# Altium footprint library bethu.PcbLib: 628 footprints (part 7 of 40)
Each footprint in its own frame and in the unit in brackets; x right, y up, seen from the top. Pads: shape width x height; smd on the part's side, far side on the other; paste and mask are expansions set on the pad; w line width, h text height; cw(c..) or ccw(c..) is an arc to the next point about the centre after c.
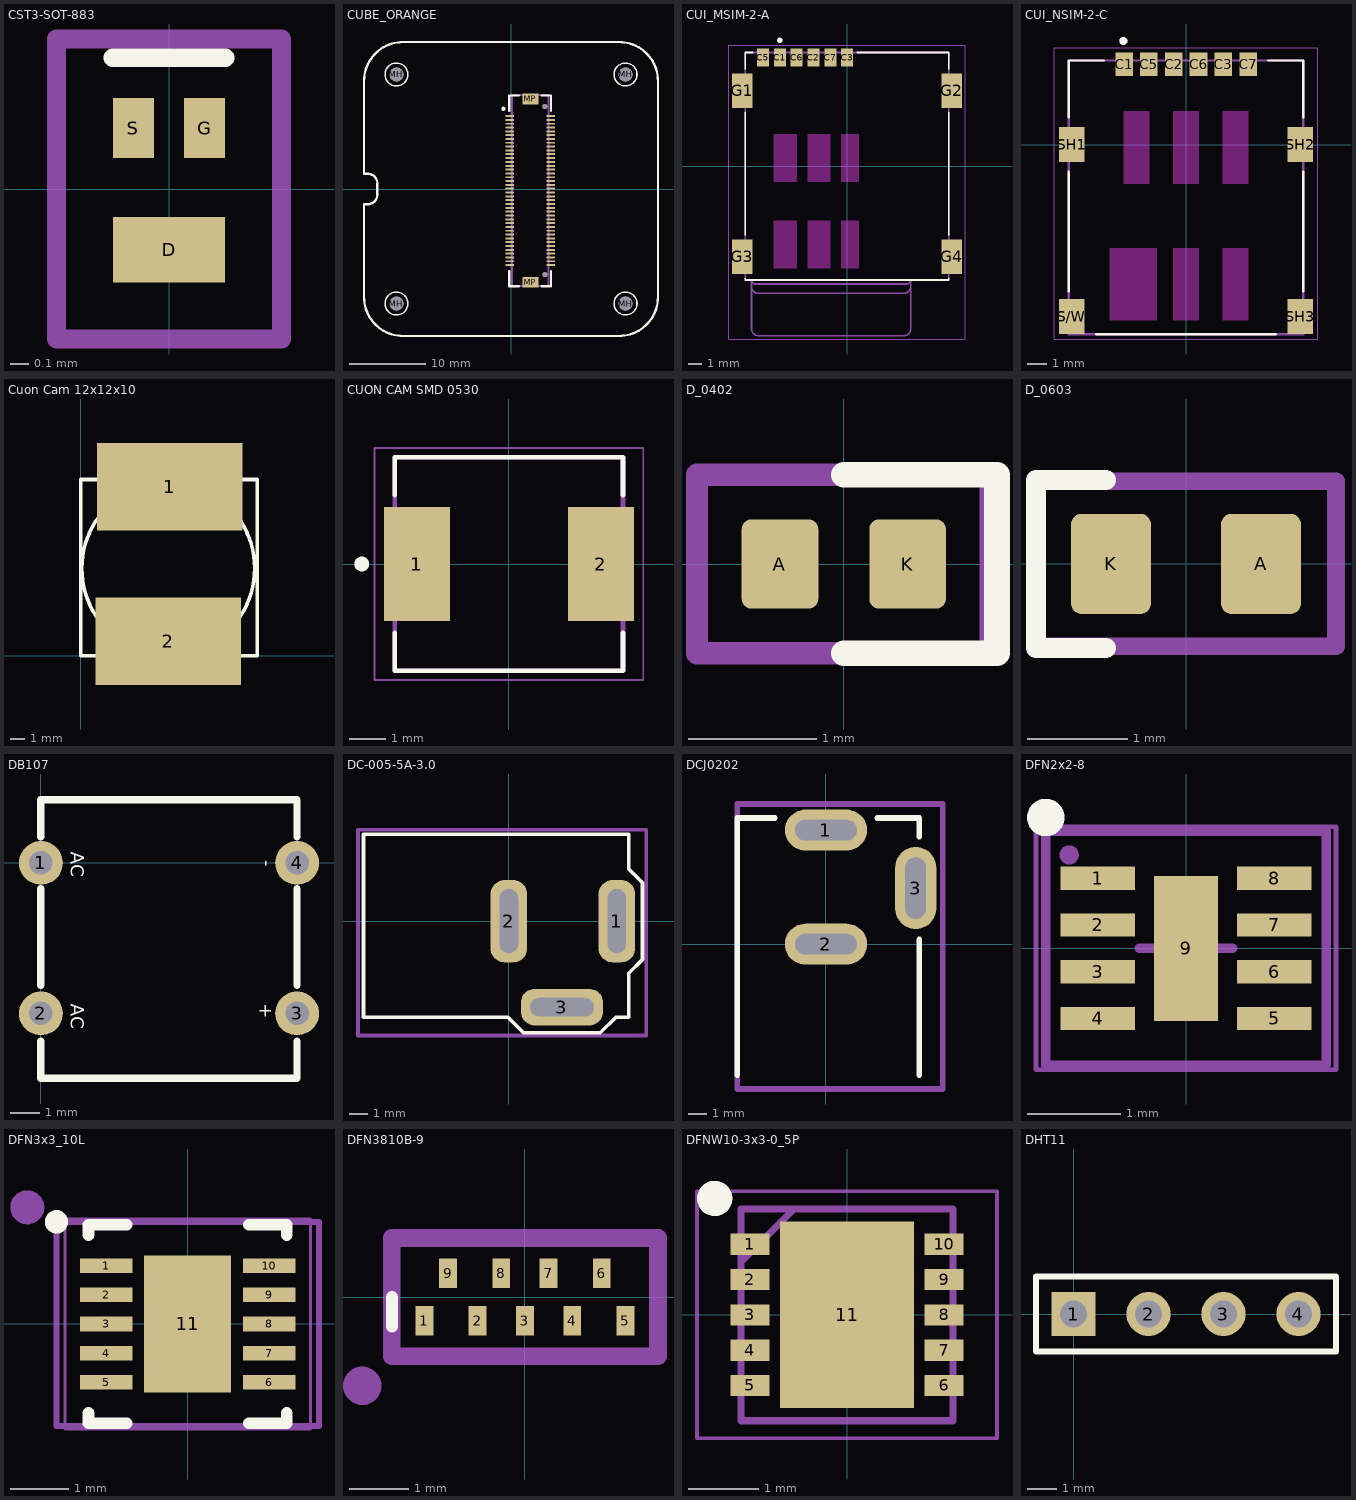
[diagram p6: the footprints below, top view; thin cyan lines are the x and y axes]

## CST3-SOT-883 [mm]
pads (3):
  rect 0.6x0.35 smd: D(0,-0.325)
  rect 0.22x0.32 smd: G(0.19,0.325) S(-0.19,0.325)
Top Overlay:
  lines w0.1: -0.3,0.7 0.3,0.7
Mechanical 13:
  lines w0.1: -0.6,-0.8 -0.6,0.8 0.6,0.8 0.6,-0.8 -0.6,-0.8
  text "'.Designator'" at -5.665,-0.417 h1
3D body "CST3.STEP": height 0.39, standoff 0.01, extent -0.3,-0.5 0.3,0.5

## CUBE_ORANGE [mil]
pads (88):
  rect 44x10 smd mask+7.87: 1(-5.5,375.5) 2(203.83,375.5) 3(-5.5,356.5) 4(203.83,356.5) 5(-5.5,336.5) 6(203.83,336.5) 7(-5.5,316.5) 8(203.83,316.5) 9(-5.5,297.5) 10(203.83,297.5) 11(-5.5,277.5) 12(203.83,277.5) 13(-5.5,257.5) 14(203.83,257.5) 15(-5.5,238.5) 16(203.83,238.5) 17(-5.5,218.5) 18(203.83,218.5) 19(-5.5,198.5) 20(203.83,198.5) 21(-5.5,179.5) 22(203.83,179.5) 23(-5.5,159.5) 24(203.83,159.5) 25(-5.5,139.5) 26(203.83,139.5) 27(-5.5,119.5) 28(203.83,119.5) 29(-5.5,100.5) 30(203.83,100.5) 31(-5.5,80.5) 32(203.83,80.5) 33(-5.5,60.5) 34(203.83,60.5) 35(-5.5,41.5) 36(203.83,41.5) 37(-5.5,21.5) 38(203.83,21.5) 39(-5.5,1.5) 40(203.83,1.5) 41(-5.5,-18.34) 42(203.83,-18.34) 43(-5.5,-38.03) 44(203.83,-38.03) 45(-5.5,-57.71) 46(203.83,-57.71) 47(-5.5,-77.4) 48(203.83,-77.4) 49(-5.5,-97.08) 50(203.83,-97.08) 51(-5.5,-116.77) 52(203.83,-116.77) 53(-5.5,-136.45) 54(203.83,-136.45) 55(-5.5,-156.14) 56(203.83,-156.14) 57(-5.5,-175.82) 58(203.83,-175.82) 59(-5.5,-195.51) 60(203.83,-195.51) 61(-5.5,-215.19) 62(203.83,-215.19) 63(-5.5,-234.88) 64(203.83,-234.88) 65(-5.5,-254.56) 66(203.83,-254.56) 67(-5.5,-274.25) 68(203.83,-274.25) 69(-5.5,-293.93) 70(203.83,-293.93) 71(-5.5,-313.62) 72(203.83,-313.62) 73(-5.5,-333.3) 74(203.83,-333.3) 75(-5.5,-352.99) 76(203.83,-352.99) 77(-5.5,-372.67) 78(203.83,-372.67) 79(-5.5,-392.36) 80(203.83,-392.36)
  round 70.87 hole 70.87 unplated mask+19.68: MH(-590.55,-590.55) MH(-590.55,590.55) MH(590.55,-590.55) MH(590.55,590.55)
  round 26 hole 26 unplated: MH(174.3,-441.57) MH(174.3,425.5)
  rect 83x56 smd: MP(99.5,-480.94) MP(99.5,464.5)
Top Overlay:
  circle w7.87: c590.5,-590.5 r59.06
  circle w7.87: c590.5,590.5 r59.06
  circle w7.87: c-590.55,-590.55 r59.06
  circle w7.87: c-590.55,590.55 r59.06
  circle w11.81: c-39.37,413.39 r4.92
  lines w11.81: -9.84,-423.23 -9.84,-501.97 39.37,-501.97 ; -9.84,403.54 -9.84,482.28 39.37,482.28 ; 157.48,-501.97 206.69,-501.97 206.69,-423.23 ; 157.48,482.28 206.69,482.28 206.69,403.54 ; -757.87,78.74 ccw(c-757.87,78.75) -757.86,78.75 ; -757.87,78.74 -738.98,78.74 cw(c-738.98,28.74) -688.98,28.74 -688.98,0 -688.98,-28.74 cw(c-738.98,-28.74) -738.98,-78.74 -757.87,-78.74 -757.87,-557.42 ccw(c-557.42,-557.42) -557.42,-757.87 557.4,-757.87 ccw(c557.4,-557.42) 757.86,-557.42 757.87,557.42 ccw(c557.4,557.42) 557.4,757.87 -557.4,757.87 ccw(c-557.4,557.42) -757.86,557.42 -757.86,78.75
Bottom Overlay:
  circle w7.87: c590.5,-590.5 r59.06
  circle w7.87: c590.5,-590.5 r59.06
  circle w7.87: c590.5,590.5 r59.06
  circle w7.87: c590.5,590.5 r59.06
  circle w7.87: c-590.55,-590.55 r59.06
  circle w7.87: c-590.55,-590.55 r59.06
  circle w7.87: c-590.55,590.55 r59.06
  circle w7.87: c-590.55,590.55 r59.06
Top Component Center:
  lines w10: 4.5,-500.63 4.5,484.5 193.99,484.5 193.99,-500.63 4.5,-500.63
Multi-Layer:
  drawing of 4 lines, arcs and shapes, not listed
3D body "Cube.STEP": height 870.58, standoff 0.5, extent -751.96,-751.97 751.98,751.97
3D body "DF17(1_0H)-80DP-0_5V.stp": height 123.54, standoff -30.01, extent -15.41,-500.59 209,483.66

## CUI_MSIM-2-A [mm]
height 1.57
pads (10):
  rect 0.9x1.35 smd: C1(-5.07,8.19) C2(-2.53,8.19) C3(0.01,8.19) C5(-6.34,8.19) C6(-3.8,8.19) C7(-1.26,8.19)
  rect 1.55x2.6 smd: G1(-7.9,5.69) G2(7.9,5.69) G3(-7.9,-6.83) G4(7.9,-6.83)
Top Overlay:
  circle w0.2: c-5.07,9.5 r0.1
  lines w0.127: -7.67,-8.45 -7.67,-8.58 7.67,-8.58 7.67,-8.45 ; -7.67,-5.21 -7.67,4.07 ; -7.67,7.31 -7.67,8.58 -7.11,8.58 ; 0.78,8.58 7.67,8.58 7.67,7.31 ; 7.67,-5.21 7.67,4.07
Keep-Out Layer:
  region: -3.79,-7.7 -5.51,-7.7 -5.51,-4.1 -3.79,-4.1
  region: -1.25,-7.7 -2.97,-7.7 -2.97,-4.1 -1.25,-4.1
  region: 0.88,-7.7 -0.42,-7.7 -0.42,-4.1 0.88,-4.1
  region: -3.79,-1.18 -5.51,-1.18 -5.51,2.42 -3.79,2.42
  region: -1.25,-1.18 -2.97,-1.18 -2.97,2.42 -1.25,2.42
  region: 0.88,-1.18 -0.42,-1.18 -0.42,2.42 0.88,2.42
Mechanical 13:
  circle w0.2: c-5.07,9.5 r0.1
  lines w0.127: -7.2,-9.08 ccw(c-6.7,-9.08) -6.7,-9.58 4.3,-9.58 ccw(c4.3,-9.08) 4.8,-9.08 ; -7.2,-8.58 ccw(c-6.9,-8.58) -6.9,-8.88 4.5,-8.88 ccw(c4.5,-8.58) 4.8,-8.58 ; -7.2,-8.58 4.8,-8.58 ; -7.2,-8.58 -7.67,-8.58 -7.67,8.58 7.67,8.58 7.67,-8.58 4.8,-8.58 ; -7.2,-8.58 -7.2,-12.28 ccw(c-6.7,-12.28) -6.7,-12.78 4.3,-12.78 ccw(c4.3,-12.28) 4.8,-12.28 4.8,-8.58
Mechanical 15:
  lines w0.05: -8.925,-13.03 8.925,-13.03 8.925,9.115 -8.925,9.115 -8.925,-13.03
3D body "step_temp.STEP": height 2.05, standoff 0.61, extent -8.145,-8.6 8.255,8.6

## CUI_NSIM-2-C [mm]
height 1.6
pads (10):
  rect 0.9x1.2 smd: C1(-3.17,4.1) C2(-0.63,4.1) C3(1.91,4.1) C5(-1.9,4.1) C6(0.64,4.1) C7(3.18,4.1)
  rect 1.3x1.8 smd: S/W(-5.85,-8.8) SH1(-5.85,0) SH2(5.85,0) SH3(5.85,-8.8)
Top Overlay:
  circle w0.2: c-3.2,5.3 r0.1
  lines w0.127: -6,-7.5 -6,-1.4 ; -6,1.4 -6,4.3 -4.2,4.3 ; -4.6,-9.7 4.6,-9.7 ; 4.2,4.3 6,4.3 6,1.4 ; 6,-7.5 6,-1.4
Keep-Out Layer:
  region: 0.65,-2 -0.65,-2 -0.65,1.7 0.65,1.7
  region: 3.19,-2 1.89,-2 1.89,1.7 3.19,1.7
  region: 0.65,-9 -0.65,-9 -0.65,-5.3 0.65,-5.3
  region: 3.19,-9 1.89,-9 1.89,-5.3 3.19,-5.3
  region: -1.49,-9 -3.89,-9 -3.89,-5.3 -1.49,-5.3
  region: -1.89,-2 -3.19,-2 -3.19,1.7 -1.89,1.7
Mechanical 13:
  circle w0.2: c-3.2,5.3 r0.1
  lines w0.127: -6,-9.7 -6,4.3 6,4.3 6,-9.7 -6,-9.7
Mechanical 15:
  lines w0.05: -6.75,-9.95 -6.75,4.95 6.75,4.95 6.75,-9.95 -6.75,-9.95
3D body "step_temp.STEP": height 1.45, standoff 0.02, extent -6.223,-9.59 6.177,4.51

## Cuon Cam 12x12x10 [mm] "Cuon Cam 12x12x10"
pads (2):
  rect 10x6 smd: 1(6.1,11.6) 2(6,1)
Top Overlay:
  circle w0.254: c6,6 r5.941
  lines w0.254: 0,0 0,12.1 12.1,12.1 12.1,9.2 12.1,0 0,0
3D body "CUON CAM CDRH127 3A SMD.step": height 7.51, standoff 0.06, extent 0.096,-0.202 12.096,12.14

## CUON CAM SMD 0530 [mm] "CUON CAM SMD 0530"
pads (2):
  rect 1.8x3.1 smd: 1(-2.5,0) 2(2.5,0)
Top Overlay:
  circle w0.2: c-4,0 r0.1
  lines w0.127: -3.1,-1.863 -3.1,-2.9 3.1,-2.9 3.1,-1.863 ; -3.1,1.863 -3.1,2.9 3.1,2.9 3.1,1.863
Mechanical 13:
  circle w0.2: c-4,0 r0.1
  lines w0.127: -3.1,-2.9 3.1,-2.9 3.1,2.9 -3.1,2.9 -3.1,-2.9
Mechanical 15:
  lines w0.05: -3.65,-3.15 -3.65,3.15 3.65,3.15 3.65,-3.15 -3.65,-3.15
3D body "FDV0530-H-1R5M=P3--3DModel-STEP-46669.STEP": height 3, standoff 0, extent -3.1,-2.879 3.1,2.921

## D_0402 [mm]
pads (2):
  rrect25% 0.6x0.7 smd: A(-0.5,0) K(0.5,0)
Top Overlay:
  lines w0.2: 0,-0.7 1.2,-0.7 1.2,0.7 0,0.7
Mechanical 13:
  lines w0.175: -1.15,-0.7 1.15,-0.7 1.15,0.7 -1.15,0.7 -1.15,-0.7
  text "'.Designator'" at -5.665,-0.417 h1
3D body "D0402.stp": height 0.51, standoff 0.01, extent -0.5,-0.25 0.5,0.25

## D_0603 [mm]
pads (2):
  rrect25% 0.8x1 smd: A(0.75,0) K(-0.75,0)
Top Overlay:
  lines w0.2: -0.8,-0.843 -1.5,-0.843 -1.5,0 -1.5,0.841 -0.8,0.841
Mechanical 13:
  lines w0.175: -1.5,-0.825 -1.5,0.825 1.5,0.825 1.5,-0.825 -1.5,-0.825
  text "'.Designator'" at -5.665,-0.417 h1
3D body "D_TVS_0603.stp": height 0.81, standoff 0.01, extent -0.8,-0.45 0.8,0.45

## DB107 [mm]
pads (4):
  round 1.5 hole 0.8: 1(0,0) 2(0,-5.15) 3(8.765,-5.15) 4(8.765,0)
Top Overlay:
  lines w0.254: 0,-6.096 0,-7.366 1.016,-7.366 8.763,-7.366 8.763,-6.096 ; 0,-4.191 0,-0.889 ; 0,0.889 0,2.159 8.763,2.159 8.763,0.889 ; 8.763,-4.191 8.763,-0.889
  text "-" at 7.874,-0.127 h0.46
  text "+" at 7.874,-5.334 h0.46
  text "AC" at 1.016,-4.826 h0.46
  text "AC" at 1.016,0.381 h0.46
3D body "diod.STEP": height 6.65, standoff -3.26, extent -0.306,-7.316 9.094,2.084

## DC-005-5A-3.0 [mm]
pads (3):
  rrect75% 2x4.5 hole 1 slot 3.5 at 90 deg mask+0.07: 1(5.9,0) 2(0,0)
  rrect75% 4.5x2 hole 1 slot 3.5 at 0 deg mask+0.07: 3(2.9,-4.7)
Top Overlay:
  lines w0.2: -7.95,-5.25 -0.05,-5.25 0.8,-6.1 5,-6.1 5.85,-5.25 6.55,-5.25 6.55,-2.85 7.3,-2.1 7.3,2.1 6.55,2.85 6.55,4.75 -7.95,4.75 -7.95,-5.25
Mechanical 13:
  lines w0.2: -8.25,-6.25 -8.25,5 7.5,5 7.5,-6.25 -8.25,-6.25
  text "'.Designator'" at -7.231,-1.087 h1.25
3D body "dc-005-5a-3_0.stp": height 11.01, standoff -3.59, extent -7.7,-4.9 6.3,4.5

## DCJ0202 [mm]
pads (3):
  oval 4.4x2.2 hole 1.1 slot 3.3 at 0 deg: 1(0,6.1) 2(0,0)
  oval 2.2x4.4 hole 1.1 slot 3.3 at 90 deg: 3(4.8,3)
Top Overlay:
  lines w0.3: -4.75,-7 -4.75,6.75 -2.75,6.75 ; 2.75,6.75 5,6.75 5,5.75 ; 5,-7 5,0.25
Mechanical 13:
  lines w0.3: -4.75,-7.75 -4.75,7.5 6.25,7.5 6.25,-7.75 -4.75,-7.75
  text "'.Designator'" at -5.665,-0.417 h1
3D body "DCJ0202.step": height 11.01, standoff -3.49, extent -4.518,-7.481 4.837,6.519

## DFN2x2-8 [mm]
height 0.65
pads (9):
  rect 0.8x0.25 smd mask+0.15: 1(-0.945,0.75) 2(-0.945,0.25) 3(-0.945,-0.25) 4(-0.945,-0.75) 5(0.945,-0.75) 6(0.945,-0.25) 7(0.945,0.25) 8(0.945,0.75)
  rect 0.69x1.55 smd: 9(0,0)
Top Overlay:
  circle w0.2: c-1.5,1.4 r0.1
Mechanical 13:
  circle w0.1: c-1.25,1 r0.053
  lines w0.1: -1.5,-1.25 1.5,-1.25 1.5,1.25 -1.5,1.25 -1.5,-1.25
  text "'.Designator'" at -5.815,-0.9 h1
Mechanical 15:
  lines w0.05: -1.605,-1.3 1.605,-1.3 1.605,1.3 -1.605,1.3 -1.605,-1.3
  lines w0.1: -0.5,0 0.5,0 ; 0,-0.5 0,0.5
3D body "DFN2x2-8.step": height 0.65, standoff 0, extent -1.051,-1.05 1.051,1.05

## DFN3x3_10L [mm]
height 0.8
pads (11):
  rect 0.9x0.25 smd mask+0.15: 1(-1.395,1) 2(-1.395,0.5) 3(-1.395,0) 4(-1.395,-0.5) 5(-1.395,-1) 6(1.395,-1) 7(1.395,-0.5) 8(1.395,0) 9(1.395,0.5) 10(1.395,1)
  rect 1.49x2.35 smd: 11(0,0)
Top Overlay:
  circle w0.3: c-2.25,1.75 r0.05
  lines w0.2: -1.7,-1.525 -1.7,-1.7 -1.045,-1.7 ; -1.7,1.525 -1.7,1.7 -1.045,1.7 ; 1.045,-1.7 1.7,-1.7 1.7,-1.525 ; 1.045,1.7 1.7,1.7 1.7,1.525
Mechanical 13:
  circle w0.3: c-2.75,2 r0.141
  lines w0.1: -2.25,-1.75 -2.25,1.75 2.25,1.75 2.25,-1.75 -2.25,-1.75
  text "'.Designator'" at -5.665,-0.417 h1
Mechanical 15:
  lines w0.05: -2.105,-1.8 -2.105,1.8 2.105,1.8 2.105,-1.8 -2.105,-1.8
  lines w0.1: -0.5,0 0.5,0 ; 0,-0.5 0,0.5
3D body "DFN3x3_10L.step": height 0.8, standoff 0, extent -1.551,-1.55 1.551,1.55

## DFN3810B-9 [mm]
pads (9):
  rect 0.3x0.5 smd: 1(-1.7,-0.4) 2(-0.8,-0.4) 3(0,-0.4) 4(0.8,-0.4) 5(1.7,-0.4) 6(1.3,0.4) 7(0.4,0.4) 8(-0.4,0.4) 9(-1.3,0.4)
Top Overlay:
  lines w0.2: -2.25,-0.5 -2.25,0
Mechanical 13:
  circle w0.5: c-2.75,-1.5 r0.073
  lines w0.3: -2.25,-1 -2.25,1 2.25,1 2.25,-1 -2.25,-1
  text "'.Designator'" at -5.815,-0.9 h1
3D body "DFN3810B-9.stp": height 0.5, standoff 0, extent -1.9,-0.5 1.9,0.5

## DFNW10-3x3-0_5P [mm]
pads (11):
  rect 0.55x0.3 smd mask+0.15: 1(-1.375,1) 2(-1.375,0.5) 3(-1.375,0) 4(-1.375,-0.5) 5(-1.375,-1) 6(1.375,-1) 7(1.375,-0.5) 8(1.375,0) 9(1.375,0.5) 10(1.375,1)
  rect 1.9x2.64 smd: 11(0,0)
Top Overlay:
  circle w0.25: c-1.875,1.65 r0.125
Mechanical 13:
  lines w0.1: -1.5,0.75 -0.75,1.5 ; -1.5,-1.5 1.5,-1.5 1.5,1.5 -1.5,1.5 -1.5,-1.5
  text "'.Designator'" at -5.815,-0.9 h1
Mechanical 15:
  lines w0.05: -2.125,-1.75 2.125,-1.75 2.125,1.75 -2.125,1.75 -2.125,-1.75
3D body "NCP51200MNTXG.stp": height 1, standoff 0, extent -1.55,-1.5 1.55,1.5

## DHT11 [mm]
pads (4):
  rect 1.5x1.5 hole 0.9: 1(0,0)
  round 1.5 hole 0.9: 2(2.54,0) 3(5.08,0) 4(7.62,0)
Top Overlay:
  lines w0.2: -1.27,-1.27 -1.27,1.27 8.89,1.27 8.89,-1.27 -1.27,-1.27
3D body "User Library-DHT11.STEP": height 23.25, standoff -0.25, extent -2.19,-2.833 9.81,2.667
3D body "User Library-RM254_4pin.STEP": height 6.02, standoff -3.1, extent -1.27,-1.27 8.89,1.27